# Altium footprint library Footprints.PcbLib: 50 footprints (part 4 of 4)
Each footprint in its own frame and in the unit in brackets; x right, y up, seen from the top. Pads: shape width x height; smd on the part's side, far side on the other; paste and mask are expansions set on the pad; w line width, h text height; cw(c..) or ccw(c..) is an arc to the next point about the centre after c.
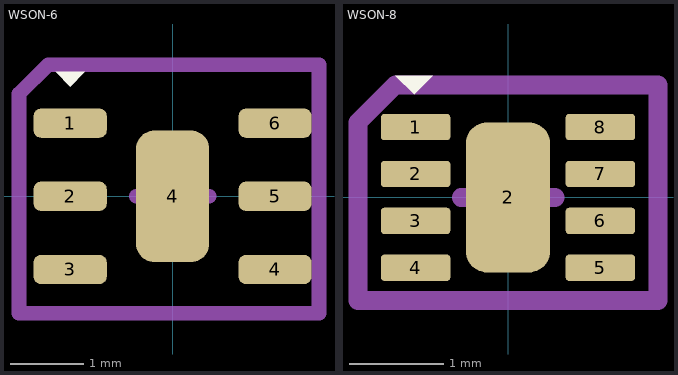
[diagram p3: the footprints below, top view; thin cyan lines are the x and y axes]

## WSON-6 [mm]
pads (7):
  rrect50% 1x0.4 smd mask+0.051: 1(-1.4,1) 2(-1.4,0) 3(-1.4,-1) 4(1.4,-1) 5(1.4,0) 6(1.4,1)
  rrect50% 1x1.8 smd mask+0.051: 4(0,0)
Top Overlay:
  region: -1.4,1.5 -1.2,1.7 -1.6,1.7
Top Assembly:
  lines w0.2: -0.5,0 0.5,0 ; 0,-0.5 0,0.5 ; -2.1,-1.6 -2.1,1.4 -1.7,1.8 2,1.8 2,-1.6 -2.1,-1.6
  text "'.Designator'" at -1.795,2.078 h1
3D body "User Library-PWSON-N6 v1.step": height 0.6, standoff 0, extent -1.5,-1.5 1.5,1.5

## WSON-8 [mm]
pads (9):
  rrect25% 0.74x0.28 smd mask+0.051: 1(-0.985,0.75) 2(-0.985,0.25) 3(-0.985,-0.25) 4(-0.985,-0.75) 5(0.985,-0.75) 6(0.985,-0.25) 7(0.985,0.25) 8(0.985,0.75)
  rrect50% 0.9x1.6 smd paste-2 mask+0.051: 2(0,0)
Top Overlay:
  region: -1,1.1 -0.8,1.3 -1.2,1.3
Top Paste:
  region: 0.28,-0.51 -0.28,-0.51 -0.28,0.51 0.28,0.51
Top Solder:
  rectangle: -1.4,-0.9 1.4,0.9
Top Assembly:
  lines w0.2: -0.5,0 0.5,0 ; 0,-0.5 0,0.5 ; -1.6,-1.1 -1.6,0.8 -1.2,1.2 1.6,1.2 1.6,-1.1 -1.6,-1.1
  text "'.Designator'" at -1.695,1.378 h1
3D body "step_temp.STEP": height 0.8, standoff 0, extent -1,-1 1,1